# Altium integrated library 860010580021_Altium_WCAP-ATG8_rev20a.IntLib: 195 symbols (part 2 of 2) (continued)
## 860010772002
designator C?, comment 0.22uF, 63V
WCAP-ATG8 Aluminum Electrolytic Capacitor, Radial, THT, D5xH11mm, 0.22uF, 63V; Manufacturer Part Number: 860010772002; Manufacturer: Wurth Elektronik; Dissipation Factor: 9%; Endurance: 2000h; Leakage Current: 3uA; Ripple Current: 4mA; Capacitance Tolerance: +/-20%; Rated Voltage: 63VDC; Technical Reference: ATBC110R22M063DSPA3B000; ComponentLink1Description: Manufacturer; ComponentLink1URL: http://www.we-online.de; ComponentLink2Description: Datasheet; ComponentLink2URL: https://www.we-online.com/catalog/datasheet/860010772002.pdf; Height: 11mm; Mounting Technology: THT; Operating Temperature: -40 to +85degC; Packaging: Ammo Pack; Published Date: May 2020; Capacitance: 0.22uF; Diameter: 5mm
footprint WCAP-ATG8_5x11
pins: 1 N, 2 P

## 860010772003
designator C?, comment 0.33uF, 63V
WCAP-ATG8 Aluminum Electrolytic Capacitor, Radial, THT, D5xH11mm, 0.33uF, 63V; Manufacturer Part Number: 860010772003; Manufacturer: Wurth Elektronik; Dissipation Factor: 9%; Endurance: 2000h; Leakage Current: 3uA; Ripple Current: 6mA; Capacitance Tolerance: +/-20%; Rated Voltage: 63VDC; Technical Reference: ATBC110R33M063DSPA3B000; ComponentLink1Description: Manufacturer; ComponentLink1URL: http://www.we-online.de; ComponentLink2Description: Datasheet; ComponentLink2URL: https://www.we-online.com/catalog/datasheet/860010772003.pdf; Height: 11mm; Mounting Technology: THT; Operating Temperature: -40 to +85degC; Packaging: Ammo Pack; Published Date: May 2020; Capacitance: 0.33uF; Diameter: 5mm
footprint WCAP-ATG8_5x11
pins: 1 N, 2 P

## 860010772004
designator C?, comment 0.47uF, 63V
WCAP-ATG8 Aluminum Electrolytic Capacitor, Radial, THT, D5xH11mm, 0.47uF, 63V; Manufacturer Part Number: 860010772004; Manufacturer: Wurth Elektronik; Dissipation Factor: 9%; Endurance: 2000h; Leakage Current: 3uA; Ripple Current: 8mA; Capacitance Tolerance: +/-20%; Rated Voltage: 63VDC; Technical Reference: ATBC110R47M063DSPA3B000; ComponentLink1Description: Manufacturer; ComponentLink1URL: http://www.we-online.de; ComponentLink2Description: Datasheet; ComponentLink2URL: https://www.we-online.com/catalog/datasheet/860010772004.pdf; Height: 11mm; Mounting Technology: THT; Operating Temperature: -40 to +85degC; Packaging: Ammo Pack; Published Date: May 2020; Capacitance: 0.47uF; Diameter: 5mm
footprint WCAP-ATG8_5x11
pins: 1 N, 2 P

## 860010772005
designator C?, comment 1uF, 63V
WCAP-ATG8 Aluminum Electrolytic Capacitor, Radial, THT, D5xH11mm, 1uF, 63V; Manufacturer Part Number: 860010772005; Manufacturer: Wurth Elektronik; Dissipation Factor: 9%; Endurance: 2000h; Leakage Current: 3uA; Ripple Current: 17mA; Capacitance Tolerance: +/-20%; Rated Voltage: 63VDC; Technical Reference: ATBC110010M063DSPA3B000; ComponentLink1Description: Manufacturer; ComponentLink1URL: http://www.we-online.de; ComponentLink2Description: Datasheet; ComponentLink2URL: https://www.we-online.com/catalog/datasheet/860010772005.pdf; Height: 11mm; Mounting Technology: THT; Operating Temperature: -40 to +85degC; Packaging: Ammo Pack; Published Date: May 2020; Capacitance: 1uF; Diameter: 5mm
footprint WCAP-ATG8_5x11
pins: 1 N, 2 P

## 860010772006
designator C?, comment 2.2uF, 63V
WCAP-ATG8 Aluminum Electrolytic Capacitor, Radial, THT, D5xH11mm, 2.2uF, 63V; Manufacturer Part Number: 860010772006; Manufacturer: Wurth Elektronik; Dissipation Factor: 9%; Endurance: 2000h; Leakage Current: 3uA; Ripple Current: 31mA; Capacitance Tolerance: +/-20%; Rated Voltage: 63VDC; Technical Reference: ATBC1102R2M063DSPA3B000; ComponentLink1Description: Manufacturer; ComponentLink1URL: http://www.we-online.de; ComponentLink2Description: Datasheet; ComponentLink2URL: https://www.we-online.com/catalog/datasheet/860010772006.pdf; Height: 11mm; Mounting Technology: THT; Operating Temperature: -40 to +85degC; Packaging: Ammo Pack; Published Date: May 2020; Capacitance: 2.2uF; Diameter: 5mm
footprint WCAP-ATG8_5x11
pins: 1 N, 2 P

## 860010772007
designator C?, comment 3.3uF, 63V
WCAP-ATG8 Aluminum Electrolytic Capacitor, Radial, THT, D5xH11mm, 3.3uF, 63V; Manufacturer Part Number: 860010772007; Manufacturer: Wurth Elektronik; Dissipation Factor: 9%; Endurance: 2000h; Leakage Current: 3uA; Ripple Current: 39mA; Capacitance Tolerance: +/-20%; Rated Voltage: 63VDC; Technical Reference: ATBC1103R3M063DSPA3B000; ComponentLink1Description: Manufacturer; ComponentLink1URL: http://www.we-online.de; ComponentLink2Description: Datasheet; ComponentLink2URL: https://www.we-online.com/catalog/datasheet/860010772007.pdf; Height: 11mm; Mounting Technology: THT; Operating Temperature: -40 to +85degC; Packaging: Ammo Pack; Published Date: May 2020; Capacitance: 3.3uF; Diameter: 5mm
footprint WCAP-ATG8_5x11
pins: 1 N, 2 P

## 860010772008
designator C?, comment 4.7uF, 63V
WCAP-ATG8 Aluminum Electrolytic Capacitor, Radial, THT, D5xH11mm, 4.7uF, 63V; Manufacturer Part Number: 860010772008; Manufacturer: Wurth Elektronik; Dissipation Factor: 9%; Endurance: 2000h; Leakage Current: 3uA; Ripple Current: 50mA; Capacitance Tolerance: +/-20%; Rated Voltage: 63VDC; Technical Reference: ATBC1104R7M063DSPA3B000; ComponentLink1Description: Manufacturer; ComponentLink1URL: http://www.we-online.de; ComponentLink2Description: Datasheet; ComponentLink2URL: https://www.we-online.com/catalog/datasheet/860010772008.pdf; Height: 11mm; Mounting Technology: THT; Operating Temperature: -40 to +85degC; Packaging: Ammo Pack; Published Date: May 2020; Capacitance: 4.7uF; Diameter: 5mm
footprint WCAP-ATG8_5x11
pins: 1 N, 2 P

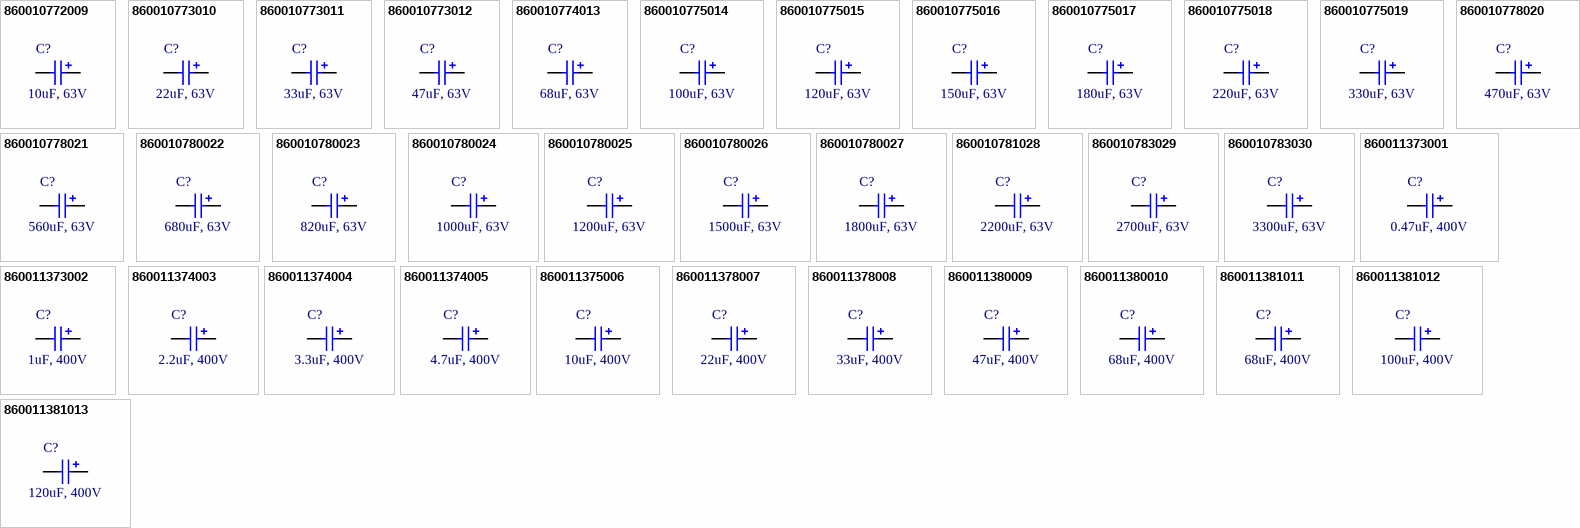
[diagram p4: symbols 860010772009 to 860011381013]

## 860010772009
designator C?, comment 10uF, 63V
WCAP-ATG8 Aluminum Electrolytic Capacitor, Radial, THT, D5xH11mm, 10uF, 63V; Manufacturer Part Number: 860010772009; Manufacturer: Wurth Elektronik; Dissipation Factor: 9%; Endurance: 2000h; Leakage Current: 6.3uA; Ripple Current: 77mA; Capacitance Tolerance: +/-20%; Rated Voltage: 63VDC; Technical Reference: ATBC110100M063DSPA3B000; ComponentLink1Description: Manufacturer; ComponentLink1URL: http://www.we-online.de; ComponentLink2Description: Datasheet; ComponentLink2URL: https://www.we-online.com/catalog/datasheet/860010772009.pdf; Height: 11mm; Mounting Technology: THT; Operating Temperature: -40 to +85degC; Packaging: Ammo Pack; Published Date: May 2020; Capacitance: 10uF; Diameter: 5mm
footprint WCAP-ATG8_5x11
pins: 1 N, 2 P

## 860010773010
designator C?, comment 22uF, 63V
WCAP-ATG8 Aluminum Electrolytic Capacitor, Radial, THT, D6.3xH11mm, 22uF, 63V; Manufacturer Part Number: 860010773010; Manufacturer: Wurth Elektronik; Dissipation Factor: 9%; Endurance: 2000h; Leakage Current: 13.86uA; Ripple Current: 127mA; Capacitance Tolerance: +/-20%; Rated Voltage: 63VDC; Technical Reference: ATBD110220M063DSPA4B000; ComponentLink1Description: Manufacturer; ComponentLink1URL: http://www.we-online.de; ComponentLink2Description: Datasheet; ComponentLink2URL: https://www.we-online.com/catalog/datasheet/860010773010.pdf; Height: 11mm; Mounting Technology: THT; Operating Temperature: -40 to +85degC; Packaging: Ammo Pack; Published Date: May 2020; Capacitance: 22uF; Diameter: 6.3mm
footprint WCAP-ATG8_6.3x11
pins: 1 N, 2 P

## 860010773011
designator C?, comment 33uF, 63V
WCAP-ATG8 Aluminum Electrolytic Capacitor, Radial, THT, D6.3xH11mm, 33uF, 63V; Manufacturer Part Number: 860010773011; Manufacturer: Wurth Elektronik; Dissipation Factor: 9%; Endurance: 2000h; Leakage Current: 20.79uA; Ripple Current: 149mA; Capacitance Tolerance: +/-20%; Rated Voltage: 63VDC; Technical Reference: ATBD110330M063DSPA4B000; ComponentLink1Description: Manufacturer; ComponentLink1URL: http://www.we-online.de; ComponentLink2Description: Datasheet; ComponentLink2URL: https://www.we-online.com/catalog/datasheet/860010773011.pdf; Height: 11mm; Mounting Technology: THT; Operating Temperature: -40 to +85degC; Packaging: Ammo Pack; Published Date: May 2020; Capacitance: 33uF; Diameter: 6.3mm
footprint WCAP-ATG8_6.3x11
pins: 1 N, 2 P

## 860010773012
designator C?, comment 47uF, 63V
WCAP-ATG8 Aluminum Electrolytic Capacitor, Radial, THT, D6.3xH11mm, 47uF, 63V; Manufacturer Part Number: 860010773012; Manufacturer: Wurth Elektronik; Dissipation Factor: 9%; Endurance: 2000h; Leakage Current: 29.61uA; Ripple Current: 198mA; Capacitance Tolerance: +/-20%; Rated Voltage: 63VDC; Technical Reference: ATBD110470M063DSPA4B000; ComponentLink1Description: Manufacturer; ComponentLink1URL: http://www.we-online.de; ComponentLink2Description: Datasheet; ComponentLink2URL: https://www.we-online.com/catalog/datasheet/860010773012.pdf; Height: 11mm; Mounting Technology: THT; Operating Temperature: -40 to +85degC; Packaging: Ammo Pack; Published Date: May 2020; Capacitance: 47uF; Diameter: 6.3mm
footprint WCAP-ATG8_6.3x11
pins: 1 N, 2 P

## 860010774013
designator C?, comment 68uF, 63V
WCAP-ATG8 Aluminum Electrolytic Capacitor, Radial, THT, D8xH11.5mm, 68uF, 63V; Manufacturer Part Number: 860010774013; Manufacturer: Wurth Elektronik; Dissipation Factor: 9%; Endurance: 2000h; Leakage Current: 42.84uA; Ripple Current: 253mA; Capacitance Tolerance: +/-20%; Rated Voltage: 63VDC; Technical Reference: ATBE115680M063DSPA7B000; ComponentLink1Description: Manufacturer; ComponentLink1URL: http://www.we-online.de; ComponentLink2Description: Datasheet; ComponentLink2URL: https://www.we-online.com/catalog/datasheet/860010774013.pdf; Height: 11.5mm; Mounting Technology: THT; Operating Temperature: -40 to +85degC; Packaging: Ammo Pack; Published Date: May 2020; Capacitance: 68uF; Diameter: 8mm
footprint WCAP-ATG8_8x11.5
pins: 1 N, 2 P

## 860010775014
designator C?, comment 100uF, 63V
WCAP-ATG8 Aluminum Electrolytic Capacitor, Radial, THT, D10xH12.5mm, 100uF, 63V; Manufacturer Part Number: 860010775014; Manufacturer: Wurth Elektronik; Dissipation Factor: 9%; Endurance: 2000h; Leakage Current: 63uA; Ripple Current: 330mA; Capacitance Tolerance: +/-20%; Rated Voltage: 63VDC; Technical Reference: ATBF125101M063DSPA9B000; ComponentLink1Description: Manufacturer; ComponentLink1URL: http://www.we-online.de; ComponentLink2Description: Datasheet; ComponentLink2URL: https://www.we-online.com/catalog/datasheet/860010775014.pdf; Height: 12.5mm; Mounting Technology: THT; Operating Temperature: -40 to +85degC; Packaging: Ammo Pack; Published Date: May 2020; Capacitance: 100uF; Diameter: 10mm
footprint WCAP-ATG8_10x12.5
pins: 1 N, 2 P

## 860010775015
designator C?, comment 120uF, 63V
WCAP-ATG8 Aluminum Electrolytic Capacitor, Radial, THT, D10xH16mm, 120uF, 63V; Manufacturer Part Number: 860010775015; Manufacturer: Wurth Elektronik; Dissipation Factor: 9%; Endurance: 2000h; Leakage Current: 75.6uA; Ripple Current: 396mA; Capacitance Tolerance: +/-20%; Rated Voltage: 63VDC; Technical Reference: ATBF160121M063DSPAAB000; ComponentLink1Description: Manufacturer; ComponentLink1URL: http://www.we-online.de; ComponentLink2Description: Datasheet; ComponentLink2URL: https://www.we-online.com/catalog/datasheet/860010775015.pdf; Height: 16mm; Mounting Technology: THT; Operating Temperature: -40 to +85degC; Packaging: Ammo Pack; Published Date: May 2020; Capacitance: 120uF; Diameter: 10mm
footprint WCAP-ATG8_10x16
pins: 1 N, 2 P

## 860010775016
designator C?, comment 150uF, 63V
WCAP-ATG8 Aluminum Electrolytic Capacitor, Radial, THT, D10xH16mm, 150uF, 63V; Manufacturer Part Number: 860010775016; Manufacturer: Wurth Elektronik; Dissipation Factor: 9%; Endurance: 2000h; Leakage Current: 94.5uA; Ripple Current: 462mA; Capacitance Tolerance: +/-20%; Rated Voltage: 63VDC; Technical Reference: ATBF160151M063DSPAAB000; ComponentLink1Description: Manufacturer; ComponentLink1URL: http://www.we-online.de; ComponentLink2Description: Datasheet; ComponentLink2URL: https://www.we-online.com/catalog/datasheet/860010775016.pdf; Height: 16mm; Mounting Technology: THT; Operating Temperature: -40 to +85degC; Packaging: Ammo Pack; Published Date: May 2020; Capacitance: 150uF; Diameter: 10mm
footprint WCAP-ATG8_10x16
pins: 1 N, 2 P

## 860010775017
designator C?, comment 180uF, 63V
WCAP-ATG8 Aluminum Electrolytic Capacitor, Radial, THT, D10xH16mm, 180uF, 63V; Manufacturer Part Number: 860010775017; Manufacturer: Wurth Elektronik; Dissipation Factor: 9%; Endurance: 2000h; Leakage Current: 113.4uA; Ripple Current: 528mA; Capacitance Tolerance: +/-20%; Rated Voltage: 63VDC; Technical Reference: ATBF160181M063DSPAAB000; ComponentLink1Description: Manufacturer; ComponentLink1URL: http://www.we-online.de; ComponentLink2Description: Datasheet; ComponentLink2URL: https://www.we-online.com/catalog/datasheet/860010775017.pdf; Height: 16mm; Mounting Technology: THT; Operating Temperature: -40 to +85degC; Packaging: Ammo Pack; Published Date: May 2020; Capacitance: 180uF; Diameter: 10mm
footprint WCAP-ATG8_10x16
pins: 1 N, 2 P

## 860010775018
designator C?, comment 220uF, 63V
WCAP-ATG8 Aluminum Electrolytic Capacitor, Radial, THT, D10xH16mm, 220uF, 63V; Manufacturer Part Number: 860010775018; Manufacturer: Wurth Elektronik; Dissipation Factor: 9%; Endurance: 2000h; Leakage Current: 138.6uA; Ripple Current: 550mA; Capacitance Tolerance: +/-20%; Rated Voltage: 63VDC; Technical Reference: ATBF160221M063DSPAAB000; ComponentLink1Description: Manufacturer; ComponentLink1URL: http://www.we-online.de; ComponentLink2Description: Datasheet; ComponentLink2URL: https://www.we-online.com/catalog/datasheet/860010775018.pdf; Height: 16mm; Mounting Technology: THT; Operating Temperature: -40 to +85degC; Packaging: Ammo Pack; Published Date: May 2020; Capacitance: 220uF; Diameter: 10mm
footprint WCAP-ATG8_10x16
pins: 1 N, 2 P

## 860010775019
designator C?, comment 330uF, 63V
WCAP-ATG8 Aluminum Electrolytic Capacitor, Radial, THT, D10xH20mm, 330uF, 63V; Manufacturer Part Number: 860010775019; Manufacturer: Wurth Elektronik; Dissipation Factor: 9%; Endurance: 2000h; Leakage Current: 207.9uA; Ripple Current: 759mA; Capacitance Tolerance: +/-20%; Rated Voltage: 63VDC; Technical Reference: ATBF200331M063DSPAAB000; ComponentLink1Description: Manufacturer; ComponentLink1URL: http://www.we-online.de; ComponentLink2Description: Datasheet; ComponentLink2URL: https://www.we-online.com/catalog/datasheet/860010775019.pdf; Height: 20mm; Mounting Technology: THT; Operating Temperature: -40 to +85degC; Packaging: Ammo Pack; Published Date: May 2020; Capacitance: 330uF; Diameter: 10mm
footprint WCAP-ATG8_10x20
pins: 1 N, 2 P

## 860010778020
designator C?, comment 470uF, 63V
WCAP-ATG8 Aluminum Electrolytic Capacitor, Radial, THT, D13xH20mm, 470uF, 63V; Manufacturer Part Number: 860010778020; Manufacturer: Wurth Elektronik; Dissipation Factor: 9%; Endurance: 2000h; Leakage Current: 296.1uA; Ripple Current: 968mA; Capacitance Tolerance: +/-20%; Rated Voltage: 63VDC; Technical Reference: ATBI200471M063DSPACB000; ComponentLink1Description: Manufacturer; ComponentLink1URL: http://www.we-online.de; ComponentLink2Description: Datasheet; ComponentLink2URL: https://www.we-online.com/catalog/datasheet/860010778020.pdf; Height: 20mm; Mounting Technology: THT; Operating Temperature: -40 to +85degC; Packaging: Ammo Pack; Published Date: May 2020; Capacitance: 470uF; Diameter: 13mm
footprint WCAP-ATG8_13x20
pins: 1 N, 2 P

## 860010778021
designator C?, comment 560uF, 63V
WCAP-ATG8 Aluminum Electrolytic Capacitor, Radial, THT, D13xH25mm, 560uF, 63V; Manufacturer Part Number: 860010778021; Manufacturer: Wurth Elektronik; Dissipation Factor: 9%; Endurance: 2000h; Leakage Current: 352.8uA; Ripple Current: 1056mA; Capacitance Tolerance: +/-20%; Rated Voltage: 63VDC; Technical Reference: ATBI250561M063DSPACB000; ComponentLink1Description: Manufacturer; ComponentLink1URL: http://www.we-online.de; ComponentLink2Description: Datasheet; ComponentLink2URL: https://www.we-online.com/catalog/datasheet/860010778021.pdf; Height: 25mm; Mounting Technology: THT; Operating Temperature: -40 to +85degC; Packaging: Ammo Pack; Published Date: May 2020; Capacitance: 560uF; Diameter: 13mm
footprint WCAP-ATG8_13x25
pins: 1 N, 2 P

## 860010780022
designator C?, comment 680uF, 63V
WCAP-ATG8 Aluminum Electrolytic Capacitor, Radial, THT, D16xH25mm, 680uF, 63V; Manufacturer Part Number: 860010780022; Manufacturer: Wurth Elektronik; Dissipation Factor: 9%; Endurance: 2000h; Leakage Current: 428.4uA; Ripple Current: 1265mA; Capacitance Tolerance: +/-20%; Rated Voltage: 63VDC; Technical Reference: ATBK250681M063DSPAEB000; ComponentLink1Description: Manufacturer; ComponentLink1URL: http://www.we-online.de; ComponentLink2Description: Datasheet; ComponentLink2URL: https://www.we-online.com/catalog/datasheet/860010780022.pdf; Height: 25mm; Mounting Technology: THT; Operating Temperature: -40 to +85degC; Packaging: Ammo Pack; Published Date: May 2020; Capacitance: 680uF; Diameter: 16mm
footprint WCAP-ATG8_16x25
pins: 1 N, 2 P

## 860010780023
designator C?, comment 820uF, 63V
WCAP-ATG8 Aluminum Electrolytic Capacitor, Radial, THT, D16xH25mm, 820uF, 63V; Manufacturer Part Number: 860010780023; Manufacturer: Wurth Elektronik; Dissipation Factor: 9%; Endurance: 2000h; Leakage Current: 516.6uA; Ripple Current: 1430mA; Capacitance Tolerance: +/-20%; Rated Voltage: 63VDC; Technical Reference: ATBK250821M063DSPAEB000; ComponentLink1Description: Manufacturer; ComponentLink1URL: http://www.we-online.de; ComponentLink2Description: Datasheet; ComponentLink2URL: https://www.we-online.com/catalog/datasheet/860010780023.pdf; Height: 25mm; Mounting Technology: THT; Operating Temperature: -40 to +85degC; Packaging: Ammo Pack; Published Date: May 2020; Capacitance: 820uF; Diameter: 16mm
footprint WCAP-ATG8_16x25
pins: 1 N, 2 P

## 860010780024
designator C?, comment 1000uF, 63V
WCAP-ATG8 Aluminum Electrolytic Capacitor, Radial, THT, D16xH25mm, 1000uF, 63V; Manufacturer Part Number: 860010780024; Manufacturer: Wurth Elektronik; Dissipation Factor: 9%; Endurance: 2000h; Leakage Current: 630uA; Ripple Current: 1540mA; Capacitance Tolerance: +/-20%; Rated Voltage: 63VDC; Technical Reference: ATBK250102M063DSPAEB000; ComponentLink1Description: Manufacturer; ComponentLink1URL: http://www.we-online.de; ComponentLink2Description: Datasheet; ComponentLink2URL: https://www.we-online.com/catalog/datasheet/860010780024.pdf; Height: 25mm; Mounting Technology: THT; Operating Temperature: -40 to +85degC; Packaging: Ammo Pack; Published Date: May 2020; Capacitance: 1000uF; Diameter: 16mm
footprint WCAP-ATG8_16x25
pins: 1 N, 2 P

## 860010780025
designator C?, comment 1200uF, 63V
WCAP-ATG8 Aluminum Electrolytic Capacitor, Radial, THT, D16xH31.5mm, 1200uF, 63V; Manufacturer Part Number: 860010780025; Manufacturer: Wurth Elektronik; Dissipation Factor: 9%; Endurance: 2000h; Leakage Current: 756uA; Ripple Current: 1837mA; Capacitance Tolerance: +/-20%; Rated Voltage: 63VDC; Technical Reference: ATBK315122M063DSPADB000; ComponentLink1Description: Manufacturer; ComponentLink1URL: http://www.we-online.de; ComponentLink2Description: Datasheet; ComponentLink2URL: https://www.we-online.com/catalog/datasheet/860010780025.pdf; Height: 31.5mm; Mounting Technology: THT; Operating Temperature: -40 to +85degC; Packaging: Ammo Pack; Published Date: May 2020; Capacitance: 1200uF; Diameter: 16mm
footprint WCAP-ATG8_16x31.5
pins: 1 N, 2 P

## 860010780026
designator C?, comment 1500uF, 63V
WCAP-ATG8 Aluminum Electrolytic Capacitor, Radial, THT, D16xH35.5mm, 1500uF, 63V; Manufacturer Part Number: 860010780026; Manufacturer: Wurth Elektronik; Dissipation Factor: 9%; Endurance: 2000h; Leakage Current: 945uA; Ripple Current: 2090mA; Capacitance Tolerance: +/-20%; Rated Voltage: 63VDC; Technical Reference: ATBK355152M063DSPADB000; ComponentLink1Description: Manufacturer; ComponentLink1URL: http://www.we-online.de; ComponentLink2Description: Datasheet; ComponentLink2URL: https://www.we-online.com/catalog/datasheet/860010780026.pdf; Height: 35.5mm; Mounting Technology: THT; Operating Temperature: -40 to +85degC; Packaging: Ammo Pack; Published Date: May 2020; Capacitance: 1500uF; Diameter: 16mm
footprint WCAP-ATG8_16x35.5
pins: 1 N, 2 P

## 860010780027
designator C?, comment 1800uF, 63V
WCAP-ATG8 Aluminum Electrolytic Capacitor, Radial, THT, D16xH35.5mm, 1800uF, 63V; Manufacturer Part Number: 860010780027; Manufacturer: Wurth Elektronik; Dissipation Factor: 9%; Endurance: 2000h; Leakage Current: 1134uA; Ripple Current: 2255mA; Capacitance Tolerance: +/-20%; Rated Voltage: 63VDC; Technical Reference: ATBK355182M063DSPADB000; ComponentLink1Description: Manufacturer; ComponentLink1URL: http://www.we-online.de; ComponentLink2Description: Datasheet; ComponentLink2URL: https://www.we-online.com/catalog/datasheet/860010780027.pdf; Height: 35.5mm; Mounting Technology: THT; Operating Temperature: -40 to +85degC; Packaging: Ammo Pack; Published Date: May 2020; Capacitance: 1800uF; Diameter: 16mm
footprint WCAP-ATG8_16x35.5
pins: 1 N, 2 P

## 860010781028
designator C?, comment 2200uF, 63V
WCAP-ATG8 Aluminum Electrolytic Capacitor, Radial, THT, D18xH35.5mm, 2200uF, 63V; Manufacturer Part Number: 860010781028; Manufacturer: Wurth Elektronik; Dissipation Factor: 9%; Endurance: 2000h; Leakage Current: 1386uA; Ripple Current: 2475mA; Capacitance Tolerance: +/-20%; Rated Voltage: 63VDC; Technical Reference: ATBL355222M063DSPAEB000; ComponentLink1Description: Manufacturer; ComponentLink1URL: http://www.we-online.de; ComponentLink2Description: Datasheet; ComponentLink2URL: https://www.we-online.com/catalog/datasheet/860010781028.pdf; Height: 35.5mm; Mounting Technology: THT; Operating Temperature: -40 to +85degC; Packaging: Ammo Pack; Published Date: May 2020; Capacitance: 2200uF; Diameter: 18mm
footprint WCAP-ATG8_18x35.5
pins: 1 N, 2 P

## 860010783029
designator C?, comment 2700uF, 63V
WCAP-ATG8 Aluminum Electrolytic Capacitor, Radial, THT, D22xH41mm, 2700uF, 63V; Manufacturer Part Number: 860010783029; Manufacturer: Wurth Elektronik; Dissipation Factor: 9%; Endurance: 2000h; Leakage Current: 1701uA; Ripple Current: 2860mA; Capacitance Tolerance: +/-20%; Rated Voltage: 63VDC; Technical Reference: ATBN410272M063DSPS2B000; ComponentLink1Description: Manufacturer; ComponentLink1URL: http://www.we-online.de; ComponentLink2Description: Datasheet; ComponentLink2URL: https://www.we-online.com/catalog/datasheet/860010783029.pdf; Height: 41mm; Mounting Technology: THT; Operating Temperature: -40 to +85degC; Packaging: Ammo Pack; Published Date: May 2020; Capacitance: 2700uF; Diameter: 22mm
footprint WCAP-ATG8_22x41
pins: 1 N, 2 P

## 860010783030
designator C?, comment 3300uF, 63V
WCAP-ATG8 Aluminum Electrolytic Capacitor, Radial, THT, D22xH41mm, 3300uF, 63V; Manufacturer Part Number: 860010783030; Manufacturer: Wurth Elektronik; Dissipation Factor: 9%; Endurance: 2000h; Leakage Current: 2079uA; Ripple Current: 3080mA; Capacitance Tolerance: +/-20%; Rated Voltage: 63VDC; Technical Reference: ATBN410332M063DSPS2B000; ComponentLink1Description: Manufacturer; ComponentLink1URL: http://www.we-online.de; ComponentLink2Description: Datasheet; ComponentLink2URL: https://www.we-online.com/catalog/datasheet/860010783030.pdf; Height: 41mm; Mounting Technology: THT; Operating Temperature: -40 to +85degC; Packaging: Ammo Pack; Published Date: May 2020; Capacitance: 3300uF; Diameter: 22mm
footprint WCAP-ATG8_22x41
pins: 1 N, 2 P

## 860011373001
designator C?, comment 0.47uF, 400V
WCAP-ATG8 Aluminum Electrolytic Capacitor, Radial, THT, D6.3xH11mm, 0.47uF, 400V; Manufacturer Part Number: 860011373001; Manufacturer: Wurth Elektronik; Dissipation Factor: 15%; Endurance: 2000h; Leakage Current: 5.64uA; Ripple Current: 12mA; Capacitance Tolerance: +/-20%; Rated Voltage: 400VDC; Technical Reference: ATAD110R47M400DSPA4B000; ComponentLink1Description: Manufacturer; ComponentLink1URL: http://www.we-online.de; ComponentLink2Description: Datasheet; ComponentLink2URL: https://www.we-online.com/catalog/datasheet/860011373001.pdf; Height: 11mm; Mounting Technology: THT; Operating Temperature: -25 to +85degC; Packaging: Ammo Pack; Published Date: May 2020; Capacitance: 0.47uF; Diameter: 6.3mm
footprint WCAP-ATG8_6.3x11
pins: 1 N, 2 P

## 860011373002
designator C?, comment 1uF, 400V
WCAP-ATG8 Aluminum Electrolytic Capacitor, Radial, THT, D6.3xH11mm, 1uF, 400V; Manufacturer Part Number: 860011373002; Manufacturer: Wurth Elektronik; Dissipation Factor: 15%; Endurance: 2000h; Leakage Current: 12uA; Ripple Current: 20mA; Capacitance Tolerance: +/-20%; Rated Voltage: 400VDC; Technical Reference: ATAD110010M400DSPA4B000; ComponentLink1Description: Manufacturer; ComponentLink1URL: http://www.we-online.de; ComponentLink2Description: Datasheet; ComponentLink2URL: https://www.we-online.com/catalog/datasheet/860011373002.pdf; Height: 11mm; Mounting Technology: THT; Operating Temperature: -25 to +85degC; Packaging: Ammo Pack; Published Date: May 2020; Capacitance: 1uF; Diameter: 6.3mm
footprint WCAP-ATG8_6.3x11
pins: 1 N, 2 P

## 860011374003
designator C?, comment 2.2uF, 400V
WCAP-ATG8 Aluminum Electrolytic Capacitor, Radial, THT, D8xH11.5mm, 2.2uF, 400V; Manufacturer Part Number: 860011374003; Manufacturer: Wurth Elektronik; Dissipation Factor: 15%; Endurance: 2000h; Leakage Current: 26.4uA; Ripple Current: 32mA; Capacitance Tolerance: +/-20%; Rated Voltage: 400VDC; Technical Reference: ATAE1152R2M400DSPA7B000; ComponentLink1Description: Manufacturer; ComponentLink1URL: http://www.we-online.de; ComponentLink2Description: Datasheet; ComponentLink2URL: https://www.we-online.com/catalog/datasheet/860011374003.pdf; Height: 11.5mm; Mounting Technology: THT; Operating Temperature: -25 to +85degC; Packaging: Ammo Pack; Published Date: May 2020; Capacitance: 2.2uF; Diameter: 8mm
footprint WCAP-ATG8_8x11.5
pins: 1 N, 2 P

## 860011374004
designator C?, comment 3.3uF, 400V
WCAP-ATG8 Aluminum Electrolytic Capacitor, Radial, THT, D8xH11.5mm, 3.3uF, 400V; Manufacturer Part Number: 860011374004; Manufacturer: Wurth Elektronik; Dissipation Factor: 15%; Endurance: 2000h; Leakage Current: 39.6uA; Ripple Current: 45mA; Capacitance Tolerance: +/-20%; Rated Voltage: 400VDC; Technical Reference: ATAE1153R3M400DSPA7B000; ComponentLink1Description: Manufacturer; ComponentLink1URL: http://www.we-online.de; ComponentLink2Description: Datasheet; ComponentLink2URL: https://www.we-online.com/catalog/datasheet/860011374004.pdf; Height: 11.5mm; Mounting Technology: THT; Operating Temperature: -25 to +85degC; Packaging: Ammo Pack; Published Date: May 2020; Capacitance: 3.3uF; Diameter: 8mm
footprint WCAP-ATG8_8x11.5
pins: 1 N, 2 P

## 860011374005
designator C?, comment 4.7uF, 400V
WCAP-ATG8 Aluminum Electrolytic Capacitor, Radial, THT, D8xH11.5mm, 4.7uF, 400V; Manufacturer Part Number: 860011374005; Manufacturer: Wurth Elektronik; Dissipation Factor: 15%; Endurance: 2000h; Leakage Current: 56.4uA; Ripple Current: 55mA; Capacitance Tolerance: +/-20%; Rated Voltage: 400VDC; Technical Reference: ATAE1154R7M400DSPA7B000; ComponentLink1Description: Manufacturer; ComponentLink1URL: http://www.we-online.de; ComponentLink2Description: Datasheet; ComponentLink2URL: https://www.we-online.com/catalog/datasheet/860011374005.pdf; Height: 11.5mm; Mounting Technology: THT; Operating Temperature: -25 to +85degC; Packaging: Ammo Pack; Published Date: May 2020; Capacitance: 4.7uF; Diameter: 8mm
footprint WCAP-ATG8_8x11.5
pins: 1 N, 2 P

## 860011375006
designator C?, comment 10uF, 400V
WCAP-ATG8 Aluminum Electrolytic Capacitor, Radial, THT, D10xH16mm, 10uF, 400V; Manufacturer Part Number: 860011375006; Manufacturer: Wurth Elektronik; Dissipation Factor: 15%; Endurance: 2000h; Leakage Current: 120uA; Ripple Current: 100mA; Capacitance Tolerance: +/-20%; Rated Voltage: 400VDC; Technical Reference: ATAF160100M400DSPAAB000; ComponentLink1Description: Manufacturer; ComponentLink1URL: http://www.we-online.de; ComponentLink2Description: Datasheet; ComponentLink2URL: https://www.we-online.com/catalog/datasheet/860011375006.pdf; Height: 16mm; Mounting Technology: THT; Operating Temperature: -25 to +85degC; Packaging: Ammo Pack; Published Date: May 2020; Capacitance: 10uF; Diameter: 10mm
footprint WCAP-ATG8_10x16
pins: 1 N, 2 P

## 860011378007
designator C?, comment 22uF, 400V
WCAP-ATG8 Aluminum Electrolytic Capacitor, Radial, THT, D13xH20mm, 22uF, 400V; Manufacturer Part Number: 860011378007; Manufacturer: Wurth Elektronik; Dissipation Factor: 15%; Endurance: 2000h; Leakage Current: 264uA; Ripple Current: 190mA; Capacitance Tolerance: +/-20%; Rated Voltage: 400VDC; Technical Reference: ATAI200220M400DSPACB000; ComponentLink1Description: Manufacturer; ComponentLink1URL: http://www.we-online.de; ComponentLink2Description: Datasheet; ComponentLink2URL: https://www.we-online.com/catalog/datasheet/860011378007.pdf; Height: 20mm; Mounting Technology: THT; Operating Temperature: -25 to +85degC; Packaging: Ammo Pack; Published Date: May 2020; Capacitance: 22uF; Diameter: 13mm
footprint WCAP-ATG8_13x20
pins: 1 N, 2 P

## 860011378008
designator C?, comment 33uF, 400V
WCAP-ATG8 Aluminum Electrolytic Capacitor, Radial, THT, D13xH25mm, 33uF, 400V; Manufacturer Part Number: 860011378008; Manufacturer: Wurth Elektronik; Dissipation Factor: 15%; Endurance: 2000h; Leakage Current: 396uA; Ripple Current: 230mA; Capacitance Tolerance: +/-20%; Rated Voltage: 400VDC; Technical Reference: ATAI250330M400DSPACB000; ComponentLink1Description: Manufacturer; ComponentLink1URL: http://www.we-online.de; ComponentLink2Description: Datasheet; ComponentLink2URL: https://www.we-online.com/catalog/datasheet/860011378008.pdf; Height: 25mm; Mounting Technology: THT; Operating Temperature: -25 to +85degC; Packaging: Ammo Pack; Published Date: May 2020; Capacitance: 33uF; Diameter: 13mm
footprint WCAP-ATG8_13x25
pins: 1 N, 2 P

## 860011380009
designator C?, comment 47uF, 400V
WCAP-ATG8 Aluminum Electrolytic Capacitor, Radial, THT, D16xH25mm, 47uF, 400V; Manufacturer Part Number: 860011380009; Manufacturer: Wurth Elektronik; Dissipation Factor: 15%; Endurance: 2000h; Leakage Current: 564uA; Ripple Current: 270mA; Capacitance Tolerance: +/-20%; Rated Voltage: 400VDC; Technical Reference: ATAK250470M400DSPAEB000; ComponentLink1Description: Manufacturer; ComponentLink1URL: http://www.we-online.de; ComponentLink2Description: Datasheet; ComponentLink2URL: https://www.we-online.com/catalog/datasheet/860011380009.pdf; Height: 25mm; Mounting Technology: THT; Operating Temperature: -25 to +85degC; Packaging: Ammo Pack; Published Date: May 2020; Capacitance: 47uF; Diameter: 16mm
footprint WCAP-ATG8_16x25
pins: 1 N, 2 P

## 860011380010
designator C?, comment 68uF, 400V
WCAP-ATG8 Aluminum Electrolytic Capacitor, Radial, THT, D16xH35.5mm, 68uF, 400V; Manufacturer Part Number: 860011380010; Manufacturer: Wurth Elektronik; Dissipation Factor: 15%; Endurance: 2000h; Leakage Current: 816uA; Ripple Current: 410mA; Capacitance Tolerance: +/-20%; Rated Voltage: 400VDC; Technical Reference: ATAK355680M400DSPADB000; ComponentLink1Description: Manufacturer; ComponentLink1URL: http://www.we-online.de; ComponentLink2Description: Datasheet; ComponentLink2URL: https://www.we-online.com/catalog/datasheet/860011380010.pdf; Height: 35.5mm; Mounting Technology: THT; Operating Temperature: -25 to +85degC; Packaging: Ammo Pack; Published Date: May 2020; Capacitance: 68uF; Diameter: 16mm
footprint WCAP-ATG8_16x35.5
pins: 1 N, 2 P

## 860011381011
designator C?, comment 68uF, 400V
WCAP-ATG8 Aluminum Electrolytic Capacitor, Radial, THT, D18xH25mm, 68uF, 400V; Manufacturer Part Number: 860011381011; Manufacturer: Wurth Elektronik; Dissipation Factor: 15%; Endurance: 2000h; Leakage Current: 816uA; Ripple Current: 380mA; Capacitance Tolerance: +/-20%; Rated Voltage: 400VDC; Technical Reference: ATAL250680M400DSPAEB000; ComponentLink1Description: Manufacturer; ComponentLink1URL: http://www.we-online.de; ComponentLink2Description: Datasheet; ComponentLink2URL: https://www.we-online.com/catalog/datasheet/860011381011.pdf; Height: 25mm; Mounting Technology: THT; Operating Temperature: -25 to +85degC; Packaging: Ammo Pack; Published Date: May 2020; Capacitance: 68uF; Diameter: 18mm
footprint WCAP-ATG8_18x25
pins: 1 N, 2 P

## 860011381012
designator C?, comment 100uF, 400V
WCAP-ATG8 Aluminum Electrolytic Capacitor, Radial, THT, D18xH31.5mm, 100uF, 400V; Manufacturer Part Number: 860011381012; Manufacturer: Wurth Elektronik; Dissipation Factor: 15%; Endurance: 2000h; Leakage Current: 1200uA; Ripple Current: 440mA; Capacitance Tolerance: +/-20%; Rated Voltage: 400VDC; Technical Reference: ATAL315101M400DSPAEB000; ComponentLink1Description: Manufacturer; ComponentLink1URL: http://www.we-online.de; ComponentLink2Description: Datasheet; ComponentLink2URL: https://www.we-online.com/catalog/datasheet/860011381012.pdf; Height: 31.5mm; Mounting Technology: THT; Operating Temperature: -25 to +85degC; Packaging: Ammo Pack; Published Date: May 2020; Capacitance: 100uF; Diameter: 18mm
footprint WCAP-ATG8_18x31.5
pins: 1 N, 2 P

## 860011381013
designator C?, comment 120uF, 400V
WCAP-ATG8 Aluminum Electrolytic Capacitor, Radial, THT, D18xH41mm, 120uF, 400V; Manufacturer Part Number: 860011381013; Manufacturer: Wurth Elektronik; Dissipation Factor: 15%; Endurance: 2000h; Leakage Current: 1440uA; Ripple Current: 520mA; Capacitance Tolerance: +/-20%; Rated Voltage: 400VDC; Technical Reference: ATAL410121M400DSPS1B000; ComponentLink1Description: Manufacturer; ComponentLink1URL: http://www.we-online.de; ComponentLink2Description: Datasheet; ComponentLink2URL: https://www.we-online.com/catalog/datasheet/860011381013.pdf; Height: 41mm; Mounting Technology: THT; Operating Temperature: -25 to +85degC; Packaging: Ammo Pack; Published Date: May 2020; Capacitance: 120uF; Diameter: 18mm
footprint WCAP-ATG8_18x41
pins: 1 N, 2 P